# Altium integrated library Weidmueller_OMNIMATE_Signal.IntLib: 2550 symbols (part 45 of 45)
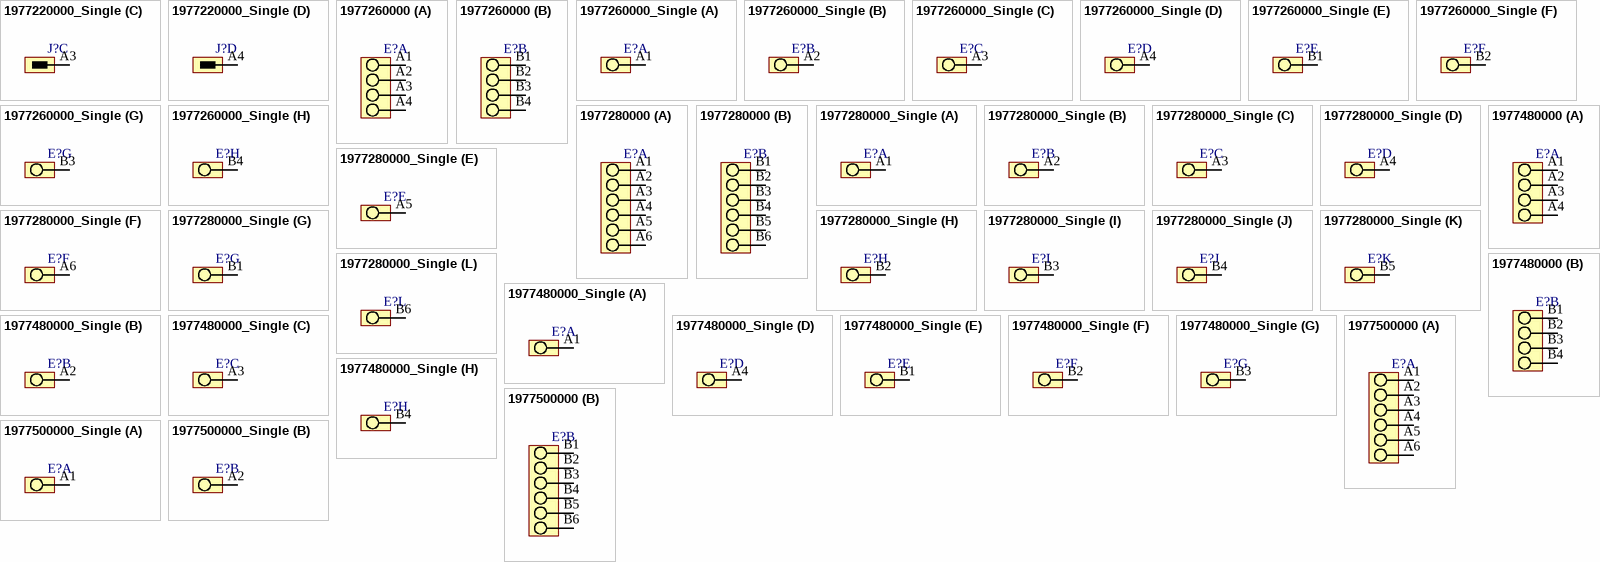
[diagram p255: symbols 1977220000_Single to 1977500000_Single]

## 1977280000_Single
designator E?
OMNIMATE Signal - series LL; PartNumber: 1977280000; Manufacturer: Weidmueller; Short_text_for_material: LL2N 5.00/12/90 3.2SN OR BX; Side_termination_characteristic: closed side; Mounting_onto_the_PCB: Solder connection; Pitch_mm: 5 mm; Pitch_inch: 0,197 inch; No_of_poles: 12; Solder_pin_length_mm: 3,2 mm; Contact_material: Cu-Leg; Contact_surface: tinned; Insulating_material: Wemid (PA); UL_94_flammability_rating: V-0; Rated_voltage_for_surge_voltage_class_pollution_degree_II_2: 500 V; Rated_current_min_no_of_poles_TU_20_deg_C: 38 A; Solid_min_H05_07_V_U: 0,5 mm²; Solid_max_H05_07_V_U: 6 mm²; Rated_voltage_use_group_B_UL_1059: 300 V; Rated_current_use_group_B_UL_1059: 20 A; Wire_cross_section_AWG_min_UL_1059: AWG 28; Wire_cross_section_AWG_max_UL_1059: AWG 12; PackageReference: LL2N_5_00_90_12; Colour: Orange; Packaging: Box; Qty: 50 PCS; Revision: V1; ComponentLink1Description: Manufacturer URL; ComponentLink1URL: http://www.weidmueller.com/; ComponentLink2Description: URL Link1; ComponentLink2URL: http://catalog.weidmueller.com/catalog/Start.do?localeId=en&ObjectID=1977280000
footprint LL2N_5_00_90_12 (OMNIMATE Signal - Serie LL  LL2N 5.00/12/90 3.2)
part A pins: A1
part B pins: A2
part C pins: A3
part D pins: A4
part E pins: A5
part F pins: A6
part G pins: B1
part H pins: B2
part I pins: B3
part J pins: B4
part K pins: B5
part L pins: B6
1 alternate drawing of the same symbol

## 1977480000
designator E?
OMNIMATE Signal - series LL; PartNumber: 1977480000; Manufacturer: Weidmueller; Short_text_for_material: LL2N 5.08/08/90 3.2SN OR BX; Side_termination_characteristic: closed side; Mounting_onto_the_PCB: Solder connection; Pitch_mm: 5,08 mm; Pitch_inch: 0,2 inch; No_of_poles: 8; Solder_pin_length_mm: 3,2 mm; Contact_material: Cu-Leg; Contact_surface: tinned; Insulating_material: Wemid (PA); UL_94_flammability_rating: V-0; Rated_voltage_for_surge_voltage_class_pollution_degree_II_2: 500 V; Rated_current_min_no_of_poles_TU_20_deg_C: 38 A; Solid_min_H05_07_V_U: 0,5 mm²; Solid_max_H05_07_V_U: 6 mm²; Rated_voltage_use_group_B_UL_1059: 300 V; Rated_current_use_group_B_UL_1059: 20 A; Wire_cross_section_AWG_min_UL_1059: AWG 28; Wire_cross_section_AWG_max_UL_1059: AWG 12; PackageReference: LL2N_5_08_90_08; Colour: Orange; Packaging: Box; Qty: 50 PCS; Revision: V1; ComponentLink1Description: Manufacturer URL; ComponentLink1URL: http://www.weidmueller.com/; ComponentLink2Description: URL Link1; ComponentLink2URL: http://catalog.weidmueller.com/catalog/Start.do?localeId=en&ObjectID=1977480000
footprint LL2N_5_08_90_08 (OMNIMATE Signal - Serie LL  LL2N 5.08/08/90 3.2)
part A pins: A1, A2, A3, A4
part B pins: B1, B2, B3, B4
1 alternate drawing of the same symbol

## 1977480000_Single
designator E?
OMNIMATE Signal - series LL; PartNumber: 1977480000; Manufacturer: Weidmueller; Short_text_for_material: LL2N 5.08/08/90 3.2SN OR BX; Side_termination_characteristic: closed side; Mounting_onto_the_PCB: Solder connection; Pitch_mm: 5,08 mm; Pitch_inch: 0,2 inch; No_of_poles: 8; Solder_pin_length_mm: 3,2 mm; Contact_material: Cu-Leg; Contact_surface: tinned; Insulating_material: Wemid (PA); UL_94_flammability_rating: V-0; Rated_voltage_for_surge_voltage_class_pollution_degree_II_2: 500 V; Rated_current_min_no_of_poles_TU_20_deg_C: 38 A; Solid_min_H05_07_V_U: 0,5 mm²; Solid_max_H05_07_V_U: 6 mm²; Rated_voltage_use_group_B_UL_1059: 300 V; Rated_current_use_group_B_UL_1059: 20 A; Wire_cross_section_AWG_min_UL_1059: AWG 28; Wire_cross_section_AWG_max_UL_1059: AWG 12; PackageReference: LL2N_5_08_90_08; Colour: Orange; Packaging: Box; Qty: 50 PCS; Revision: V1; ComponentLink1Description: Manufacturer URL; ComponentLink1URL: http://www.weidmueller.com/; ComponentLink2Description: URL Link1; ComponentLink2URL: http://catalog.weidmueller.com/catalog/Start.do?localeId=en&ObjectID=1977480000
footprint LL2N_5_08_90_08 (OMNIMATE Signal - Serie LL  LL2N 5.08/08/90 3.2)
part A pins: A1
part B pins: A2
part C pins: A3
part D pins: A4
part E pins: B1
part F pins: B2
part G pins: B3
part H pins: B4
1 alternate drawing of the same symbol

## 1977500000
designator E?
OMNIMATE Signal - series LL; PartNumber: 1977500000; Manufacturer: Weidmueller; Short_text_for_material: LL2N 5.08/12/90 3.2SN OR BX; Side_termination_characteristic: closed side; Mounting_onto_the_PCB: Solder connection; Pitch_mm: 5,08 mm; Pitch_inch: 0,2 inch; No_of_poles: 12; Solder_pin_length_mm: 3,2 mm; Contact_material: Cu-Leg; Contact_surface: tinned; Insulating_material: Wemid (PA); UL_94_flammability_rating: V-0; Rated_voltage_for_surge_voltage_class_pollution_degree_II_2: 500 V; Rated_current_min_no_of_poles_TU_20_deg_C: 38 A; Solid_min_H05_07_V_U: 0,5 mm²; Solid_max_H05_07_V_U: 6 mm²; Rated_voltage_use_group_B_UL_1059: 300 V; Rated_current_use_group_B_UL_1059: 20 A; Wire_cross_section_AWG_min_UL_1059: AWG 28; Wire_cross_section_AWG_max_UL_1059: AWG 12; PackageReference: LL2N_5_08_90_12; Colour: Orange; Packaging: Box; Qty: 50 PCS; Revision: V1; ComponentLink1Description: Manufacturer URL; ComponentLink1URL: http://www.weidmueller.com/; ComponentLink2Description: URL Link1; ComponentLink2URL: http://catalog.weidmueller.com/catalog/Start.do?localeId=en&ObjectID=1977500000
footprint LL2N_5_08_90_12 (OMNIMATE Signal - Serie LL  LL2N 5.08/12/90 3.2)
part A pins: A1, A2, A3, A4, A5, A6
part B pins: B1, B2, B3, B4, B5, B6
1 alternate drawing of the same symbol

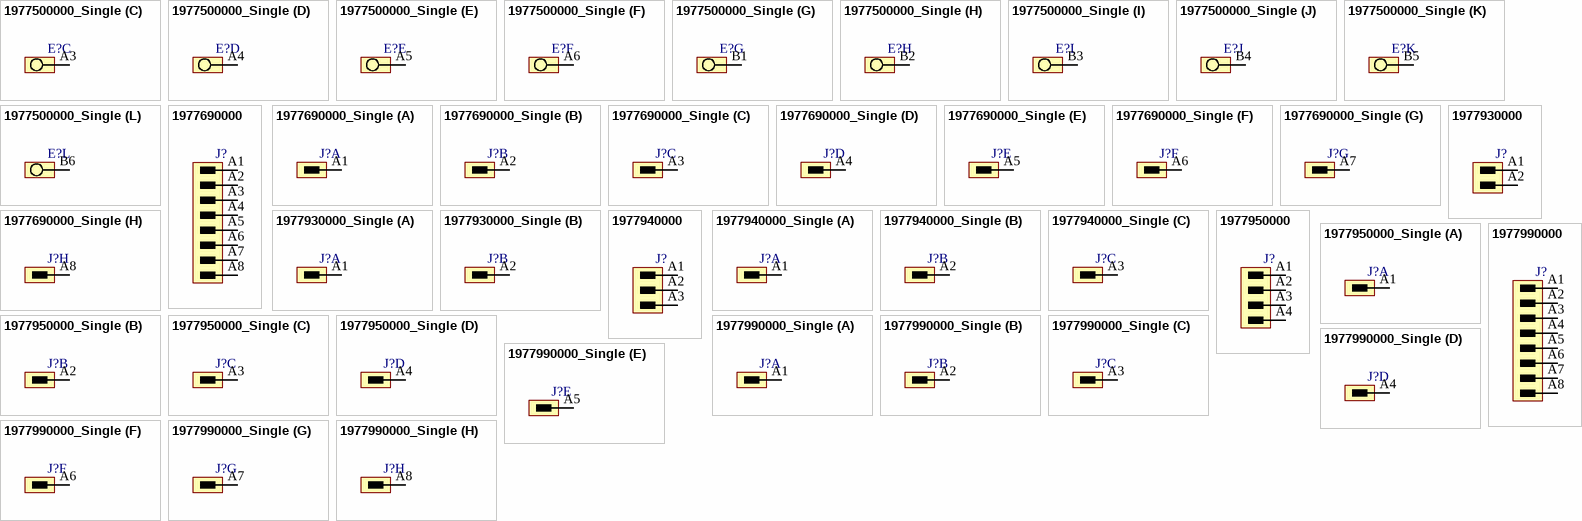
[diagram p207: symbols 1977500000_Single to 1977990000_Single]

## 1977500000_Single
designator E?
OMNIMATE Signal - series LL; PartNumber: 1977500000; Manufacturer: Weidmueller; Short_text_for_material: LL2N 5.08/12/90 3.2SN OR BX; Side_termination_characteristic: closed side; Mounting_onto_the_PCB: Solder connection; Pitch_mm: 5,08 mm; Pitch_inch: 0,2 inch; No_of_poles: 12; Solder_pin_length_mm: 3,2 mm; Contact_material: Cu-Leg; Contact_surface: tinned; Insulating_material: Wemid (PA); UL_94_flammability_rating: V-0; Rated_voltage_for_surge_voltage_class_pollution_degree_II_2: 500 V; Rated_current_min_no_of_poles_TU_20_deg_C: 38 A; Solid_min_H05_07_V_U: 0,5 mm²; Solid_max_H05_07_V_U: 6 mm²; Rated_voltage_use_group_B_UL_1059: 300 V; Rated_current_use_group_B_UL_1059: 20 A; Wire_cross_section_AWG_min_UL_1059: AWG 28; Wire_cross_section_AWG_max_UL_1059: AWG 12; PackageReference: LL2N_5_08_90_12; Colour: Orange; Packaging: Box; Qty: 50 PCS; Revision: V1; ComponentLink1Description: Manufacturer URL; ComponentLink1URL: http://www.weidmueller.com/; ComponentLink2Description: URL Link1; ComponentLink2URL: http://catalog.weidmueller.com/catalog/Start.do?localeId=en&ObjectID=1977500000
footprint LL2N_5_08_90_12 (OMNIMATE Signal - Serie LL  LL2N 5.08/12/90 3.2)
part A pins: A1
part B pins: A2
part C pins: A3
part D pins: A4
part E pins: A5
part F pins: A6
part G pins: B1
part H pins: B2
part I pins: B3
part J pins: B4
part K pins: B5
part L pins: B6
1 alternate drawing of the same symbol

## 1977690000
designator J?
OMNIMATE Signal - series BC/SC 3.81; PartNumber: 1977690000; Manufacturer: Weidmueller; Short_text_for_material: SC-SMT 3.81/08/135G 3.2SN BK BX; Side_termination_characteristic: closed side; Mounting_onto_the_PCB: Reflow solder connection; Pitch_mm: 3.81 mm; Pitch_inch: 0.15 inch; No_of_poles: 8; Outgoing_elbow: 135°; Solder_pin_length_mm: 3.2 mm; Contact_material: Cu-Leg; Contact_surface: tinned; Insulating_material: LCP GF; UL_94_flammability_rating: V-0; Rated_voltage_for_surge_voltage_class_pollution_degree_II_2: 320 V; Rated_current_min_no_of_poles_TU_20_deg_C: 38 A; Rated_voltage_use_group_B_UL_1059: 300 V; Rated_current_use_group_B_UL_1059: 10 A; PackageReference: SC_SMT_3_81_135G_08; Colour: Black; Packaging: Box; Qty: 50 PCS; Revision: V1; ComponentLink1Description: Manufacturer URL; ComponentLink1URL: http://www.weidmueller.com/; ComponentLink2Description: URL Link1; ComponentLink2URL: http://catalog.weidmueller.com/catalog/Start.do?localeId=en&ObjectID=1977690000
footprint SC_SMT_3_81_135G_08 (OMNIMATE Signal - Serie BC/SC 3.81  SC-SMT 3.81/08/135G 3.2)
pins: A1, A2, A3, A4, A5, A6, A7, A8

## 1977690000_Single
designator J?
OMNIMATE Signal - series BC/SC 3.81; PartNumber: 1977690000; Manufacturer: Weidmueller; Short_text_for_material: SC-SMT 3.81/08/135G 3.2SN BK BX; Side_termination_characteristic: closed side; Mounting_onto_the_PCB: Reflow solder connection; Pitch_mm: 3.81 mm; Pitch_inch: 0.15 inch; No_of_poles: 8; Outgoing_elbow: 135°; Solder_pin_length_mm: 3.2 mm; Contact_material: Cu-Leg; Contact_surface: tinned; Insulating_material: LCP GF; UL_94_flammability_rating: V-0; Rated_voltage_for_surge_voltage_class_pollution_degree_II_2: 320 V; Rated_current_min_no_of_poles_TU_20_deg_C: 38 A; Rated_voltage_use_group_B_UL_1059: 300 V; Rated_current_use_group_B_UL_1059: 10 A; PackageReference: SC_SMT_3_81_135G_08; Colour: Black; Packaging: Box; Qty: 50 PCS; Revision: V1; ComponentLink1Description: Manufacturer URL; ComponentLink1URL: http://www.weidmueller.com/; ComponentLink2Description: URL Link1; ComponentLink2URL: http://catalog.weidmueller.com/catalog/Start.do?localeId=en&ObjectID=1977690000
footprint SC_SMT_3_81_135G_08 (OMNIMATE Signal - Serie BC/SC 3.81  SC-SMT 3.81/08/135G 3.2)
part A pins: A1
part B pins: A2
part C pins: A3
part D pins: A4
part E pins: A5
part F pins: A6
part G pins: A7
part H pins: A8

## 1977930000
designator J?
OMNIMATE Signal - series BC/SC 3.81; PartNumber: 1977930000; Manufacturer: Weidmueller; Short_text_for_material: SC-SMT 3.81/02/135G 1.5SN BK BX; Side_termination_characteristic: closed side; Mounting_onto_the_PCB: Reflow solder connection; Pitch_mm: 3.81 mm; Pitch_inch: 0.15 inch; No_of_poles: 2; Outgoing_elbow: 135°; Solder_pin_length_mm: 1.5 mm; Contact_surface: tinned; Insulating_material: LCP GF; UL_94_flammability_rating: V-0; Rated_voltage_for_surge_voltage_class_pollution_degree_II_2: 320 V; Rated_current_min_no_of_poles_TU_20_deg_C: 17.5 A; Rated_voltage_use_group_B_UL_1059: 300 V; Rated_current_use_group_B_UL_1059: 10 A; PackageReference: SC_SMT_3_81_135G_02; Colour: Black; Packaging: Box; Qty: 50 PCS; Revision: V1; ComponentLink1Description: Manufacturer URL; ComponentLink1URL: http://www.weidmueller.com/; ComponentLink2Description: URL Link1; ComponentLink2URL: http://catalog.weidmueller.com/catalog/Start.do?localeId=en&ObjectID=1977930000
footprint SC_SMT_3_81_135G_02 (OMNIMATE Signal - Serie BC/SC 3.81  SC-SMT 3.81/02/135G 3.2)
pins: A1, A2

## 1977930000_Single
designator J?
OMNIMATE Signal - series BC/SC 3.81; PartNumber: 1977930000; Manufacturer: Weidmueller; Short_text_for_material: SC-SMT 3.81/02/135G 1.5SN BK BX; Side_termination_characteristic: closed side; Mounting_onto_the_PCB: Reflow solder connection; Pitch_mm: 3.81 mm; Pitch_inch: 0.15 inch; No_of_poles: 2; Outgoing_elbow: 135°; Solder_pin_length_mm: 1.5 mm; Contact_surface: tinned; Insulating_material: LCP GF; UL_94_flammability_rating: V-0; Rated_voltage_for_surge_voltage_class_pollution_degree_II_2: 320 V; Rated_current_min_no_of_poles_TU_20_deg_C: 17.5 A; Rated_voltage_use_group_B_UL_1059: 300 V; Rated_current_use_group_B_UL_1059: 10 A; PackageReference: SC_SMT_3_81_135G_02; Colour: Black; Packaging: Box; Qty: 50 PCS; Revision: V1; ComponentLink1Description: Manufacturer URL; ComponentLink1URL: http://www.weidmueller.com/; ComponentLink2Description: URL Link1; ComponentLink2URL: http://catalog.weidmueller.com/catalog/Start.do?localeId=en&ObjectID=1977930000
footprint SC_SMT_3_81_135G_02 (OMNIMATE Signal - Serie BC/SC 3.81  SC-SMT 3.81/02/135G 3.2)
part A pins: A1
part B pins: A2

## 1977940000
designator J?
OMNIMATE Signal - series BC/SC 3.81; PartNumber: 1977940000; Manufacturer: Weidmueller; Short_text_for_material: SC-SMT 3.81/03/135G 1.5SN BK BX; Side_termination_characteristic: closed side; Mounting_onto_the_PCB: Reflow solder connection; Pitch_mm: 3.81 mm; Pitch_inch: 0.15 inch; No_of_poles: 3; Outgoing_elbow: 135°; Solder_pin_length_mm: 1.5 mm; Contact_surface: tinned; Insulating_material: LCP GF; UL_94_flammability_rating: V-0; Rated_voltage_for_surge_voltage_class_pollution_degree_II_2: 320 V; Rated_current_min_no_of_poles_TU_20_deg_C: 17.5 A; Rated_voltage_use_group_B_UL_1059: 300 V; Rated_current_use_group_B_UL_1059: 10 A; PackageReference: SC_SMT_3_81_135G_03; Colour: Black; Packaging: Box; Qty: 50 PCS; Revision: V1; ComponentLink1Description: Manufacturer URL; ComponentLink1URL: http://www.weidmueller.com/; ComponentLink2Description: URL Link1; ComponentLink2URL: http://catalog.weidmueller.com/catalog/Start.do?localeId=en&ObjectID=1977940000
footprint SC_SMT_3_81_135G_03 (OMNIMATE Signal - Serie BC/SC 3.81  SC-SMT 3.81/03/135G 3.2)
pins: A1, A2, A3

## 1977940000_Single
designator J?
OMNIMATE Signal - series BC/SC 3.81; PartNumber: 1977940000; Manufacturer: Weidmueller; Short_text_for_material: SC-SMT 3.81/03/135G 1.5SN BK BX; Side_termination_characteristic: closed side; Mounting_onto_the_PCB: Reflow solder connection; Pitch_mm: 3.81 mm; Pitch_inch: 0.15 inch; No_of_poles: 3; Outgoing_elbow: 135°; Solder_pin_length_mm: 1.5 mm; Contact_surface: tinned; Insulating_material: LCP GF; UL_94_flammability_rating: V-0; Rated_voltage_for_surge_voltage_class_pollution_degree_II_2: 320 V; Rated_current_min_no_of_poles_TU_20_deg_C: 17.5 A; Rated_voltage_use_group_B_UL_1059: 300 V; Rated_current_use_group_B_UL_1059: 10 A; PackageReference: SC_SMT_3_81_135G_03; Colour: Black; Packaging: Box; Qty: 50 PCS; Revision: V1; ComponentLink1Description: Manufacturer URL; ComponentLink1URL: http://www.weidmueller.com/; ComponentLink2Description: URL Link1; ComponentLink2URL: http://catalog.weidmueller.com/catalog/Start.do?localeId=en&ObjectID=1977940000
footprint SC_SMT_3_81_135G_03 (OMNIMATE Signal - Serie BC/SC 3.81  SC-SMT 3.81/03/135G 3.2)
part A pins: A1
part B pins: A2
part C pins: A3

## 1977950000
designator J?
OMNIMATE Signal - series BC/SC 3.81; PartNumber: 1977950000; Manufacturer: Weidmueller; Short_text_for_material: SC-SMT 3.81/04/135G 1.5SN BK BX; Side_termination_characteristic: closed side; Mounting_onto_the_PCB: Reflow solder connection; Pitch_mm: 3.81 mm; Pitch_inch: 0.15 inch; No_of_poles: 4; Outgoing_elbow: 135°; Solder_pin_length_mm: 1.5 mm; Contact_surface: tinned; Insulating_material: LCP GF; UL_94_flammability_rating: V-0; Rated_voltage_for_surge_voltage_class_pollution_degree_II_2: 320 V; Rated_current_min_no_of_poles_TU_20_deg_C: 17.5 A; Rated_voltage_use_group_B_UL_1059: 300 V; Rated_current_use_group_B_UL_1059: 10 A; PackageReference: SC_SMT_3_81_135G_04; Colour: Black; Packaging: Box; Qty: 50 PCS; Revision: V1; ComponentLink1Description: Manufacturer URL; ComponentLink1URL: http://www.weidmueller.com/; ComponentLink2Description: URL Link1; ComponentLink2URL: http://catalog.weidmueller.com/catalog/Start.do?localeId=en&ObjectID=1977950000
footprint SC_SMT_3_81_135G_04 (OMNIMATE Signal - Serie BC/SC 3.81  SC-SMT 3.81/04/135G 3.2)
pins: A1, A2, A3, A4

## 1977950000_Single
designator J?
OMNIMATE Signal - series BC/SC 3.81; PartNumber: 1977950000; Manufacturer: Weidmueller; Short_text_for_material: SC-SMT 3.81/04/135G 1.5SN BK BX; Side_termination_characteristic: closed side; Mounting_onto_the_PCB: Reflow solder connection; Pitch_mm: 3.81 mm; Pitch_inch: 0.15 inch; No_of_poles: 4; Outgoing_elbow: 135°; Solder_pin_length_mm: 1.5 mm; Contact_surface: tinned; Insulating_material: LCP GF; UL_94_flammability_rating: V-0; Rated_voltage_for_surge_voltage_class_pollution_degree_II_2: 320 V; Rated_current_min_no_of_poles_TU_20_deg_C: 17.5 A; Rated_voltage_use_group_B_UL_1059: 300 V; Rated_current_use_group_B_UL_1059: 10 A; PackageReference: SC_SMT_3_81_135G_04; Colour: Black; Packaging: Box; Qty: 50 PCS; Revision: V1; ComponentLink1Description: Manufacturer URL; ComponentLink1URL: http://www.weidmueller.com/; ComponentLink2Description: URL Link1; ComponentLink2URL: http://catalog.weidmueller.com/catalog/Start.do?localeId=en&ObjectID=1977950000
footprint SC_SMT_3_81_135G_04 (OMNIMATE Signal - Serie BC/SC 3.81  SC-SMT 3.81/04/135G 3.2)
part A pins: A1
part B pins: A2
part C pins: A3
part D pins: A4

## 1977990000
designator J?
OMNIMATE Signal - series BC/SC 3.81; PartNumber: 1977990000; Manufacturer: Weidmueller; Short_text_for_material: SC-SMT 3.81/08/135G 1.5SN BK BX; Side_termination_characteristic: closed side; Mounting_onto_the_PCB: Reflow solder connection; Pitch_mm: 3.81 mm; Pitch_inch: 0.15 inch; No_of_poles: 8; Outgoing_elbow: 135°; Solder_pin_length_mm: 1.5 mm; Contact_surface: tinned; Insulating_material: LCP GF; UL_94_flammability_rating: V-0; Rated_voltage_for_surge_voltage_class_pollution_degree_II_2: 320 V; Rated_current_min_no_of_poles_TU_20_deg_C: 17.5 A; Rated_voltage_use_group_B_UL_1059: 300 V; Rated_current_use_group_B_UL_1059: 10 A; PackageReference: SC_SMT_3_81_135G_08; Colour: Black; Packaging: Box; Qty: 50 PCS; Revision: V1; ComponentLink1Description: Manufacturer URL; ComponentLink1URL: http://www.weidmueller.com/; ComponentLink2Description: URL Link1; ComponentLink2URL: http://catalog.weidmueller.com/catalog/Start.do?localeId=en&ObjectID=1977990000
footprint SC_SMT_3_81_135G_08 (OMNIMATE Signal - Serie BC/SC 3.81  SC-SMT 3.81/08/135G 3.2)
pins: A1, A2, A3, A4, A5, A6, A7, A8

## 1977990000_Single
designator J?
OMNIMATE Signal - series BC/SC 3.81; PartNumber: 1977990000; Manufacturer: Weidmueller; Short_text_for_material: SC-SMT 3.81/08/135G 1.5SN BK BX; Side_termination_characteristic: closed side; Mounting_onto_the_PCB: Reflow solder connection; Pitch_mm: 3.81 mm; Pitch_inch: 0.15 inch; No_of_poles: 8; Outgoing_elbow: 135°; Solder_pin_length_mm: 1.5 mm; Contact_surface: tinned; Insulating_material: LCP GF; UL_94_flammability_rating: V-0; Rated_voltage_for_surge_voltage_class_pollution_degree_II_2: 320 V; Rated_current_min_no_of_poles_TU_20_deg_C: 17.5 A; Rated_voltage_use_group_B_UL_1059: 300 V; Rated_current_use_group_B_UL_1059: 10 A; PackageReference: SC_SMT_3_81_135G_08; Colour: Black; Packaging: Box; Qty: 50 PCS; Revision: V1; ComponentLink1Description: Manufacturer URL; ComponentLink1URL: http://www.weidmueller.com/; ComponentLink2Description: URL Link1; ComponentLink2URL: http://catalog.weidmueller.com/catalog/Start.do?localeId=en&ObjectID=1977990000
footprint SC_SMT_3_81_135G_08 (OMNIMATE Signal - Serie BC/SC 3.81  SC-SMT 3.81/08/135G 3.2)
part A pins: A1
part B pins: A2
part C pins: A3
part D pins: A4
part E pins: A5
part F pins: A6
part G pins: A7
part H pins: A8

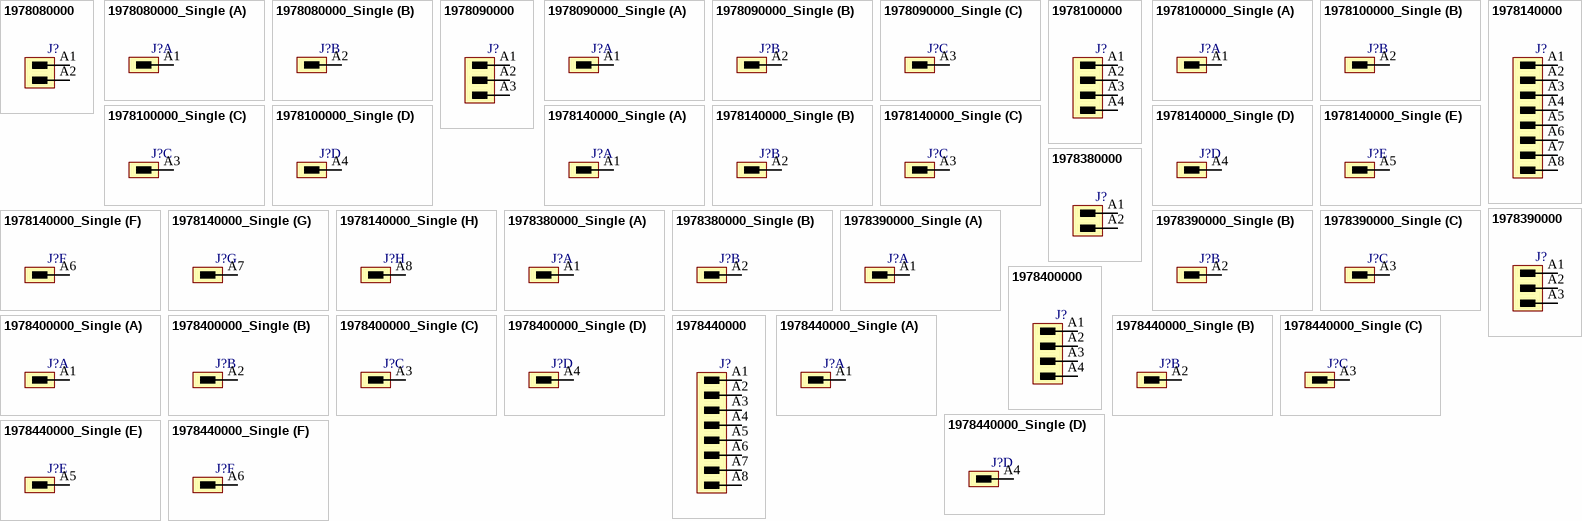
[diagram p208: symbols 1978080000 to 1978440000_Single]

## 1978080000
designator J?
OMNIMATE Signal - series BC/SC 3.81; PartNumber: 1978080000; Manufacturer: Weidmueller; Short_text_for_material: SC-SMT 3.81/02/135LF 3.2 SN BK BX; Side_termination_characteristic: Solder flange; Mounting_onto_the_PCB: Reflow solder connection; Pitch_mm: 3.81 mm; Pitch_inch: 0.15 inch; No_of_poles: 2; Outgoing_elbow: 135°; Solder_pin_length_mm: 3.2 mm; Contact_material: Cu-Leg; Contact_surface: tinned; Insulating_material: LCP GF; UL_94_flammability_rating: V-0; Rated_voltage_for_surge_voltage_class_pollution_degree_II_2: 320 V; Rated_current_min_no_of_poles_TU_20_deg_C: 38 A; Rated_voltage_use_group_B_UL_1059: 300 V; Rated_current_use_group_B_UL_1059: 10 A; PackageReference: SC_SMT_3_81_135LF_02; Colour: Black; Packaging: Box; Qty: 50 PCS; Revision: V1; ComponentLink1Description: Manufacturer URL; ComponentLink1URL: http://www.weidmueller.com/; ComponentLink2Description: URL Link1; ComponentLink2URL: http://catalog.weidmueller.com/catalog/Start.do?localeId=en&ObjectID=1978080000
footprint SC_SMT_3_81_135LF_02 (OMNIMATE Signal - Serie BC/SC 3.81  SC-SMT 3.81/02/135LF 3.2)
pins: A1, A2

## 1978080000_Single
designator J?
OMNIMATE Signal - series BC/SC 3.81; PartNumber: 1978080000; Manufacturer: Weidmueller; Short_text_for_material: SC-SMT 3.81/02/135LF 3.2 SN BK BX; Side_termination_characteristic: Solder flange; Mounting_onto_the_PCB: Reflow solder connection; Pitch_mm: 3.81 mm; Pitch_inch: 0.15 inch; No_of_poles: 2; Outgoing_elbow: 135°; Solder_pin_length_mm: 3.2 mm; Contact_material: Cu-Leg; Contact_surface: tinned; Insulating_material: LCP GF; UL_94_flammability_rating: V-0; Rated_voltage_for_surge_voltage_class_pollution_degree_II_2: 320 V; Rated_current_min_no_of_poles_TU_20_deg_C: 38 A; Rated_voltage_use_group_B_UL_1059: 300 V; Rated_current_use_group_B_UL_1059: 10 A; PackageReference: SC_SMT_3_81_135LF_02; Colour: Black; Packaging: Box; Qty: 50 PCS; Revision: V1; ComponentLink1Description: Manufacturer URL; ComponentLink1URL: http://www.weidmueller.com/; ComponentLink2Description: URL Link1; ComponentLink2URL: http://catalog.weidmueller.com/catalog/Start.do?localeId=en&ObjectID=1978080000
footprint SC_SMT_3_81_135LF_02 (OMNIMATE Signal - Serie BC/SC 3.81  SC-SMT 3.81/02/135LF 3.2)
part A pins: A1
part B pins: A2

## 1978090000
designator J?
OMNIMATE Signal - series BC/SC 3.81; PartNumber: 1978090000; Manufacturer: Weidmueller; Short_text_for_material: SC-SMT 3.81/03/135LF 3.2 SN BK BX; Side_termination_characteristic: Solder flange; Mounting_onto_the_PCB: Reflow solder connection; Pitch_mm: 3.81 mm; Pitch_inch: 0.15 inch; No_of_poles: 3; Outgoing_elbow: 135°; Solder_pin_length_mm: 3.2 mm; Contact_material: Cu-Leg; Contact_surface: tinned; Insulating_material: LCP GF; UL_94_flammability_rating: V-0; Rated_voltage_for_surge_voltage_class_pollution_degree_II_2: 320 V; Rated_current_min_no_of_poles_TU_20_deg_C: 38 A; Rated_voltage_use_group_B_UL_1059: 300 V; Rated_current_use_group_B_UL_1059: 10 A; PackageReference: SC_SMT_3_81_135LF_03; Colour: Black; Packaging: Box; Qty: 50 PCS; Revision: V1; ComponentLink1Description: Manufacturer URL; ComponentLink1URL: http://www.weidmueller.com/; ComponentLink2Description: URL Link1; ComponentLink2URL: http://catalog.weidmueller.com/catalog/Start.do?localeId=en&ObjectID=1978090000
footprint SC_SMT_3_81_135LF_03 (OMNIMATE Signal - Serie BC/SC 3.81  SC-SMT 3.81/03/135LF 3.2)
pins: A1, A2, A3

## 1978090000_Single
designator J?
OMNIMATE Signal - series BC/SC 3.81; PartNumber: 1978090000; Manufacturer: Weidmueller; Short_text_for_material: SC-SMT 3.81/03/135LF 3.2 SN BK BX; Side_termination_characteristic: Solder flange; Mounting_onto_the_PCB: Reflow solder connection; Pitch_mm: 3.81 mm; Pitch_inch: 0.15 inch; No_of_poles: 3; Outgoing_elbow: 135°; Solder_pin_length_mm: 3.2 mm; Contact_material: Cu-Leg; Contact_surface: tinned; Insulating_material: LCP GF; UL_94_flammability_rating: V-0; Rated_voltage_for_surge_voltage_class_pollution_degree_II_2: 320 V; Rated_current_min_no_of_poles_TU_20_deg_C: 38 A; Rated_voltage_use_group_B_UL_1059: 300 V; Rated_current_use_group_B_UL_1059: 10 A; PackageReference: SC_SMT_3_81_135LF_03; Colour: Black; Packaging: Box; Qty: 50 PCS; Revision: V1; ComponentLink1Description: Manufacturer URL; ComponentLink1URL: http://www.weidmueller.com/; ComponentLink2Description: URL Link1; ComponentLink2URL: http://catalog.weidmueller.com/catalog/Start.do?localeId=en&ObjectID=1978090000
footprint SC_SMT_3_81_135LF_03 (OMNIMATE Signal - Serie BC/SC 3.81  SC-SMT 3.81/03/135LF 3.2)
part A pins: A1
part B pins: A2
part C pins: A3

## 1978100000
designator J?
OMNIMATE Signal - series BC/SC 3.81; PartNumber: 1978100000; Manufacturer: Weidmueller; Short_text_for_material: SC-SMT 3.81/04/135LF 3.2 SN BK BX; Side_termination_characteristic: Solder flange; Mounting_onto_the_PCB: Reflow solder connection; Pitch_mm: 3.81 mm; Pitch_inch: 0.15 inch; No_of_poles: 4; Outgoing_elbow: 135°; Solder_pin_length_mm: 3.2 mm; Contact_material: Cu-Leg; Contact_surface: tinned; Insulating_material: LCP GF; UL_94_flammability_rating: V-0; Rated_voltage_for_surge_voltage_class_pollution_degree_II_2: 320 V; Rated_current_min_no_of_poles_TU_20_deg_C: 38 A; Rated_voltage_use_group_B_UL_1059: 300 V; Rated_current_use_group_B_UL_1059: 10 A; PackageReference: SC_SMT_3_81_135LF_04; Colour: Black; Packaging: Box; Qty: 50 PCS; Revision: V1; ComponentLink1Description: Manufacturer URL; ComponentLink1URL: http://www.weidmueller.com/; ComponentLink2Description: URL Link1; ComponentLink2URL: http://catalog.weidmueller.com/catalog/Start.do?localeId=en&ObjectID=1978100000
footprint SC_SMT_3_81_135LF_04 (OMNIMATE Signal - Serie BC/SC 3.81  SC-SMT 3.81/04/135LF 3.2)
pins: A1, A2, A3, A4

## 1978100000_Single
designator J?
OMNIMATE Signal - series BC/SC 3.81; PartNumber: 1978100000; Manufacturer: Weidmueller; Short_text_for_material: SC-SMT 3.81/04/135LF 3.2 SN BK BX; Side_termination_characteristic: Solder flange; Mounting_onto_the_PCB: Reflow solder connection; Pitch_mm: 3.81 mm; Pitch_inch: 0.15 inch; No_of_poles: 4; Outgoing_elbow: 135°; Solder_pin_length_mm: 3.2 mm; Contact_material: Cu-Leg; Contact_surface: tinned; Insulating_material: LCP GF; UL_94_flammability_rating: V-0; Rated_voltage_for_surge_voltage_class_pollution_degree_II_2: 320 V; Rated_current_min_no_of_poles_TU_20_deg_C: 38 A; Rated_voltage_use_group_B_UL_1059: 300 V; Rated_current_use_group_B_UL_1059: 10 A; PackageReference: SC_SMT_3_81_135LF_04; Colour: Black; Packaging: Box; Qty: 50 PCS; Revision: V1; ComponentLink1Description: Manufacturer URL; ComponentLink1URL: http://www.weidmueller.com/; ComponentLink2Description: URL Link1; ComponentLink2URL: http://catalog.weidmueller.com/catalog/Start.do?localeId=en&ObjectID=1978100000
footprint SC_SMT_3_81_135LF_04 (OMNIMATE Signal - Serie BC/SC 3.81  SC-SMT 3.81/04/135LF 3.2)
part A pins: A1
part B pins: A2
part C pins: A3
part D pins: A4

## 1978140000
designator J?
OMNIMATE Signal - series BC/SC 3.81; PartNumber: 1978140000; Manufacturer: Weidmueller; Short_text_for_material: SC-SMT 3.81/08/135LF 3.2 SN BK BX; Side_termination_characteristic: Solder flange; Mounting_onto_the_PCB: Reflow solder connection; Pitch_mm: 3.81 mm; Pitch_inch: 0.15 inch; No_of_poles: 8; Outgoing_elbow: 135°; Solder_pin_length_mm: 3.2 mm; Contact_material: Cu-Leg; Contact_surface: tinned; Insulating_material: LCP GF; UL_94_flammability_rating: V-0; Rated_voltage_for_surge_voltage_class_pollution_degree_II_2: 320 V; Rated_current_min_no_of_poles_TU_20_deg_C: 38 A; Rated_voltage_use_group_B_UL_1059: 300 V; Rated_current_use_group_B_UL_1059: 10 A; PackageReference: SC_SMT_3_81_135LF_08; Colour: Black; Packaging: Box; Qty: 50 PCS; Revision: V1; ComponentLink1Description: Manufacturer URL; ComponentLink1URL: http://www.weidmueller.com/; ComponentLink2Description: URL Link1; ComponentLink2URL: http://catalog.weidmueller.com/catalog/Start.do?localeId=en&ObjectID=1978140000
footprint SC_SMT_3_81_135LF_08 (OMNIMATE Signal - Serie BC/SC 3.81  SC-SMT 3.81/08/135LF 3.2)
pins: A1, A2, A3, A4, A5, A6, A7, A8

## 1978140000_Single
designator J?